# Altium footprint library CONNECTOR HDR.PcbLib: 338 footprints (part 12 of 22)
Each footprint in its own frame and in the unit in brackets; x right, y up, seen from the top. Pads: shape width x height; smd on the part's side, far side on the other; paste and mask are expansions set on the pad; w line width, h text height; cw(c..) or ccw(c..) is an arc to the next point about the centre after c.
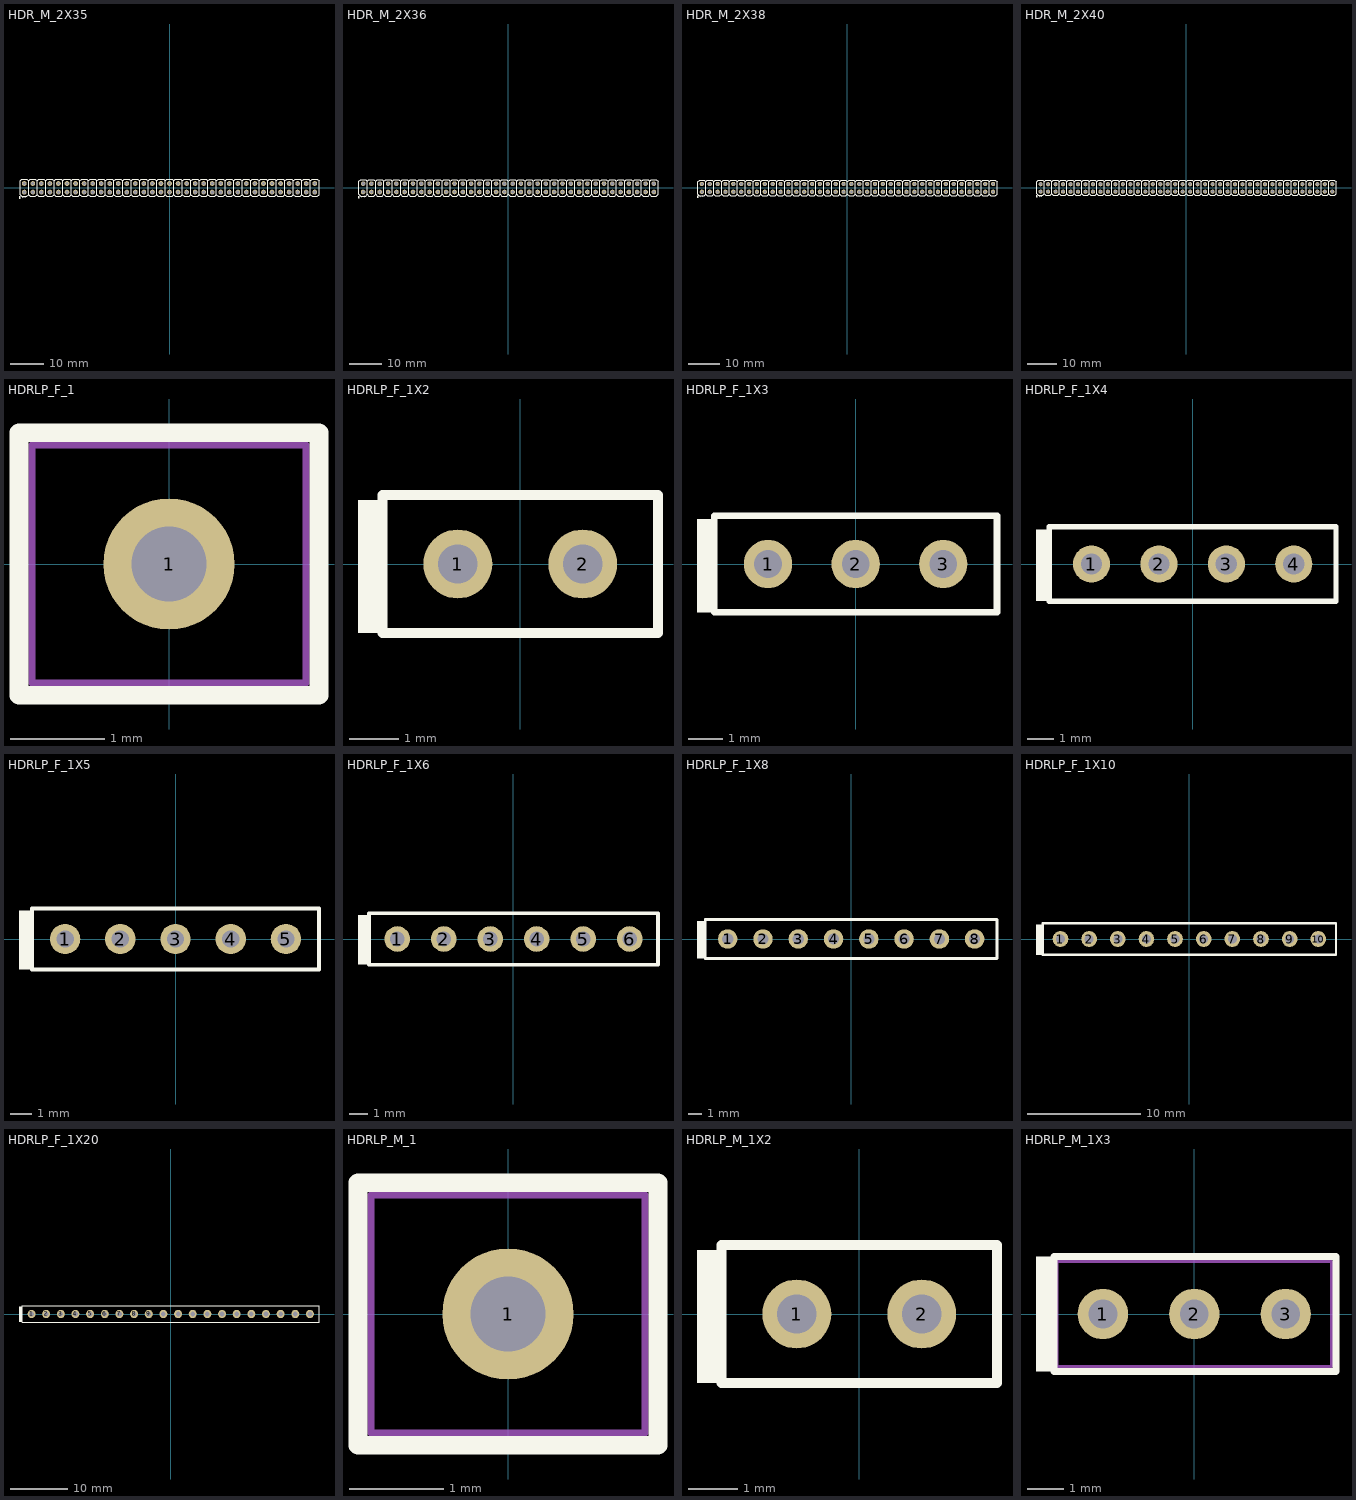
[diagram p11: the footprints below, top view; thin cyan lines are the x and y axes]

## HDR_M_2X35 [mm] "Male Header 2X35 with 2.54 mm Pitch"
pads (70):
  round 1.4 / inner round 1.4 / far side oval 1.4x2.2 hole 1: 1(-43.18,-1.27) 2(-43.18,1.27) 3(-40.64,-1.27) 4(-40.64,1.27) 5(-38.1,-1.27) 6(-38.1,1.27) 7(-35.56,-1.27) 8(-35.56,1.27) 9(-33.02,-1.27) 10(-33.02,1.27) 11(-30.48,-1.27) 12(-30.48,1.27) 13(-27.94,-1.27) 14(-27.94,1.27) 15(-25.4,-1.27) 16(-25.4,1.27) 17(-22.86,-1.27) 18(-22.86,1.27) 19(-20.32,-1.27) 20(-20.32,1.27) 21(-17.78,-1.27) 22(-17.78,1.27) 23(-15.24,-1.27) 24(-15.24,1.27) 25(-12.7,-1.27) 26(-12.7,1.27) 27(-10.16,-1.27) 28(-10.16,1.27) 29(-7.62,-1.27) 30(-7.62,1.27) 31(-5.08,-1.27) 32(-5.08,1.27) 33(-2.54,-1.27) 34(-2.54,1.27) 35(0,-1.27) 36(0,1.27) 37(2.54,-1.27) 38(2.54,1.27) 39(5.08,-1.27) 40(5.08,1.27) 41(7.62,-1.27) 42(7.62,1.27) 43(10.16,-1.27) 44(10.16,1.27) 45(12.7,-1.27) 46(12.7,1.27) 47(15.24,-1.27) 48(15.24,1.27) 49(17.78,-1.27) 50(17.78,1.27) 51(20.32,-1.27) 52(20.32,1.27) 53(22.86,-1.27) 54(22.86,1.27) 55(25.4,-1.27) 56(25.4,1.27) 57(27.94,-1.27) 58(27.94,1.27) 59(30.48,-1.27) 60(30.48,1.27) 61(33.02,-1.27) 62(33.02,1.27) 63(35.56,-1.27) 64(35.56,1.27) 65(38.1,-1.27) 66(38.1,1.27) 67(40.64,-1.27) 68(40.64,1.27) 69(43.18,-1.27) 70(43.18,1.27)
Top Overlay:
  drawing of 247 lines, arcs and shapes, not listed
  text "1" at -42.672,-3.253 h1
  text "1" at -42.672,-3.253 h1
3D body: height 8.43, standoff -2.49, extent 41.91,-2.54 44.45,0
3D body: height 8.43, standoff -2.49, extent 41.91,0 44.45,2.54
3D body: height 8.43, standoff -2.49, extent -44.45,0 -41.91,2.54
3D body: height 8.43, standoff -2.49, extent 39.37,-2.54 41.91,0
3D body: height 8.43, standoff -2.49, extent 36.83,-2.54 39.37,0
3D body: height 8.43, standoff -2.49, extent 34.29,-2.54 36.83,0
3D body: height 8.43, standoff -2.49, extent 31.75,-2.54 34.29,0
3D body: height 8.43, standoff -2.49, extent 29.21,-2.54 31.75,0
3D body: height 8.43, standoff -2.49, extent 26.67,-2.54 29.21,0
3D body: height 8.43, standoff -2.49, extent 24.13,-2.54 26.67,0
3D body: height 8.43, standoff -2.49, extent 21.59,-2.54 24.13,0
3D body: height 8.43, standoff -2.49, extent 19.05,-2.54 21.59,0
3D body: height 8.43, standoff -2.49, extent 16.51,-2.54 19.05,0
3D body: height 8.43, standoff -2.49, extent 13.97,-2.54 16.51,0
3D body: height 8.43, standoff -2.49, extent 11.43,-2.54 13.97,0
3D body: height 8.43, standoff -2.49, extent 8.89,-2.54 11.43,0
3D body: height 8.43, standoff -2.49, extent 6.35,-2.54 8.89,0
3D body: height 8.43, standoff -2.49, extent 3.81,-2.54 6.35,0
3D body: height 8.43, standoff -2.49, extent 1.27,-2.54 3.81,0
3D body: height 8.43, standoff -2.49, extent -1.27,-2.54 1.27,0
3D body: height 8.43, standoff -2.49, extent -3.81,-2.54 -1.27,0
3D body: height 8.43, standoff -2.49, extent -6.35,-2.54 -3.81,0
3D body: height 8.43, standoff -2.49, extent -8.89,-2.54 -6.35,0
3D body: height 8.43, standoff -2.49, extent -11.43,-2.54 -8.89,0
3D body: height 8.43, standoff -2.49, extent -13.97,-2.54 -11.43,0
3D body: height 8.43, standoff -2.49, extent -16.51,-2.54 -13.97,0
3D body: height 8.43, standoff -2.49, extent -19.05,-2.54 -16.51,0
3D body: height 8.43, standoff -2.49, extent -21.59,-2.54 -19.05,0
3D body: height 8.43, standoff -2.49, extent -24.13,-2.54 -21.59,0
3D body: height 8.43, standoff -2.49, extent -26.67,-2.54 -24.13,0
3D body: height 8.43, standoff -2.49, extent -29.21,-2.54 -26.67,0
3D body: height 8.43, standoff -2.49, extent -31.75,-2.54 -29.21,0
3D body: height 8.43, standoff -2.49, extent -34.29,-2.54 -31.75,0
3D body: height 8.43, standoff -2.49, extent -36.83,-2.54 -34.29,0
3D body: height 8.43, standoff -2.49, extent -39.37,-2.54 -36.83,0
3D body: height 8.43, standoff -2.49, extent -41.91,-2.54 -39.37,0
3D body: height 8.43, standoff -2.49, extent -41.91,0 -39.37,2.54
3D body: height 8.43, standoff -2.49, extent 39.37,0 41.91,2.54
3D body: height 8.43, standoff -2.49, extent 36.83,0 39.37,2.54
3D body: height 8.43, standoff -2.49, extent 34.29,0 36.83,2.54
3D body: height 8.43, standoff -2.49, extent 31.75,0 34.29,2.54
3D body: height 8.43, standoff -2.49, extent 29.21,0 31.75,2.54
3D body: height 8.43, standoff -2.49, extent 26.67,0 29.21,2.54
3D body: height 8.43, standoff -2.49, extent 24.13,0 26.67,2.54
3D body: height 8.43, standoff -2.49, extent 21.59,0 24.13,2.54
3D body: height 8.43, standoff -2.49, extent 19.05,0 21.59,2.54
3D body: height 8.43, standoff -2.49, extent 16.51,0 19.05,2.54
3D body: height 8.43, standoff -2.49, extent 13.97,0 16.51,2.54
3D body: height 8.43, standoff -2.49, extent 11.43,0 13.97,2.54
3D body: height 8.43, standoff -2.49, extent 8.89,0 11.43,2.54
3D body: height 8.43, standoff -2.49, extent 6.35,0 8.89,2.54
3D body: height 8.43, standoff -2.49, extent 3.81,0 6.35,2.54
3D body: height 8.43, standoff -2.49, extent 1.27,0 3.81,2.54
3D body: height 8.43, standoff -2.49, extent -1.27,0 1.27,2.54
3D body: height 8.43, standoff -2.49, extent -3.81,0 -1.27,2.54
3D body: height 8.43, standoff -2.49, extent -6.35,0 -3.81,2.54
3D body: height 8.43, standoff -2.49, extent -8.89,0 -6.35,2.54
3D body: height 8.43, standoff -2.49, extent -11.43,0 -8.89,2.54
3D body: height 8.43, standoff -2.49, extent -13.97,0 -11.43,2.54
3D body: height 8.43, standoff -2.49, extent -16.51,0 -13.97,2.54
3D body: height 8.43, standoff -2.49, extent -19.05,0 -16.51,2.54
3D body: height 8.43, standoff -2.49, extent -21.59,0 -19.05,2.54
3D body: height 8.43, standoff -2.49, extent -24.13,0 -21.59,2.54
3D body: height 8.43, standoff -2.49, extent -26.67,0 -24.13,2.54
3D body: height 8.43, standoff -2.49, extent -29.21,0 -26.67,2.54
3D body: height 8.43, standoff -2.49, extent -31.75,0 -29.21,2.54
3D body: height 8.43, standoff -2.49, extent -34.29,0 -31.75,2.54
3D body: height 8.43, standoff -2.49, extent -36.83,0 -34.29,2.54
3D body: height 8.43, standoff -2.49, extent -39.37,0 -36.83,2.54
3D body: height 8.43, standoff -2.49, extent -44.45,-2.54 -41.91,0

## HDR_M_2X36 [mm] "Male Header 2X36 with 2.54 mm Pitch"
pads (72):
  round 1.4 / inner round 1.4 / far side oval 1.4x2.2 hole 1: 1(-44.45,-1.27) 2(-44.45,1.27) 3(-41.91,-1.27) 4(-41.91,1.27) 5(-39.37,-1.27) 6(-39.37,1.27) 7(-36.83,-1.27) 8(-36.83,1.27) 9(-34.29,-1.27) 10(-34.29,1.27) 11(-31.75,-1.27) 12(-31.75,1.27) 13(-29.21,-1.27) 14(-29.21,1.27) 15(-26.67,-1.27) 16(-26.67,1.27) 17(-24.13,-1.27) 18(-24.13,1.27) 19(-21.59,-1.27) 20(-21.59,1.27) 21(-19.05,-1.27) 22(-19.05,1.27) 23(-16.51,-1.27) 24(-16.51,1.27) 25(-13.97,-1.27) 26(-13.97,1.27) 27(-11.43,-1.27) 28(-11.43,1.27) 29(-8.89,-1.27) 30(-8.89,1.27) 31(-6.35,-1.27) 32(-6.35,1.27) 33(-3.81,-1.27) 34(-3.81,1.27) 35(-1.27,-1.27) 36(-1.27,1.27) 37(1.27,-1.27) 38(1.27,1.27) 39(3.81,-1.27) 40(3.81,1.27) 41(6.35,-1.27) 42(6.35,1.27) 43(8.89,-1.27) 44(8.89,1.27) 45(11.43,-1.27) 46(11.43,1.27) 47(13.97,-1.27) 48(13.97,1.27) 49(16.51,-1.27) 50(16.51,1.27) 51(19.05,-1.27) 52(19.05,1.27) 53(21.59,-1.27) 54(21.59,1.27) 55(24.13,-1.27) 56(24.13,1.27) 57(26.67,-1.27) 58(26.67,1.27) 59(29.21,-1.27) 60(29.21,1.27) 61(31.75,-1.27) 62(31.75,1.27) 63(34.29,-1.27) 64(34.29,1.27) 65(36.83,-1.27) 66(36.83,1.27) 67(39.37,-1.27) 68(39.37,1.27) 69(41.91,-1.27) 70(41.91,1.27) 71(44.45,-1.27) 72(44.45,1.27)
Top Overlay:
  drawing of 254 lines, arcs and shapes, not listed
  text "1" at -43.942,-3.253 h1
  text "1" at -43.942,-3.253 h1
3D body: height 8.43, standoff -2.49, extent -45.72,-2.54 -43.18,0
3D body: height 8.43, standoff -2.49, extent -40.64,0 -38.1,2.54
3D body: height 8.43, standoff -2.49, extent -38.1,0 -35.56,2.54
3D body: height 8.43, standoff -2.49, extent -35.56,0 -33.02,2.54
3D body: height 8.43, standoff -2.49, extent -33.02,0 -30.48,2.54
3D body: height 8.43, standoff -2.49, extent -30.48,0 -27.94,2.54
3D body: height 8.43, standoff -2.49, extent -27.94,0 -25.4,2.54
3D body: height 8.43, standoff -2.49, extent -25.4,0 -22.86,2.54
3D body: height 8.43, standoff -2.49, extent -22.86,0 -20.32,2.54
3D body: height 8.43, standoff -2.49, extent -20.32,0 -17.78,2.54
3D body: height 8.43, standoff -2.49, extent -17.78,0 -15.24,2.54
3D body: height 8.43, standoff -2.49, extent -15.24,0 -12.7,2.54
3D body: height 8.43, standoff -2.49, extent -12.7,0 -10.16,2.54
3D body: height 8.43, standoff -2.49, extent -10.16,0 -7.62,2.54
3D body: height 8.43, standoff -2.49, extent -7.62,0 -5.08,2.54
3D body: height 8.43, standoff -2.49, extent -5.08,0 -2.54,2.54
3D body: height 8.43, standoff -2.49, extent -2.54,0 0,2.54
3D body: height 8.43, standoff -2.49, extent 0,0 2.54,2.54
3D body: height 8.43, standoff -2.49, extent 2.54,0 5.08,2.54
3D body: height 8.43, standoff -2.49, extent 5.08,0 7.62,2.54
3D body: height 8.43, standoff -2.49, extent 7.62,0 10.16,2.54
3D body: height 8.43, standoff -2.49, extent 10.16,0 12.7,2.54
3D body: height 8.43, standoff -2.49, extent 12.7,0 15.24,2.54
3D body: height 8.43, standoff -2.49, extent 15.24,0 17.78,2.54
3D body: height 8.43, standoff -2.49, extent 17.78,0 20.32,2.54
3D body: height 8.43, standoff -2.49, extent 20.32,0 22.86,2.54
3D body: height 8.43, standoff -2.49, extent 22.86,0 25.4,2.54
3D body: height 8.43, standoff -2.49, extent 25.4,0 27.94,2.54
3D body: height 8.43, standoff -2.49, extent 27.94,0 30.48,2.54
3D body: height 8.43, standoff -2.49, extent 30.48,0 33.02,2.54
3D body: height 8.43, standoff -2.49, extent 33.02,0 35.56,2.54
3D body: height 8.43, standoff -2.49, extent 35.56,0 38.1,2.54
3D body: height 8.43, standoff -2.49, extent 38.1,0 40.64,2.54
3D body: height 8.43, standoff -2.49, extent 40.64,0 43.18,2.54
3D body: height 8.43, standoff -2.49, extent -43.18,0 -40.64,2.54
3D body: height 8.43, standoff -2.49, extent -43.18,-2.54 -40.64,0
3D body: height 8.43, standoff -2.49, extent -40.64,-2.54 -38.1,0
3D body: height 8.43, standoff -2.49, extent -38.1,-2.54 -35.56,0
3D body: height 8.43, standoff -2.49, extent -35.56,-2.54 -33.02,0
3D body: height 8.43, standoff -2.49, extent -33.02,-2.54 -30.48,0
3D body: height 8.43, standoff -2.49, extent -30.48,-2.54 -27.94,0
3D body: height 8.43, standoff -2.49, extent -27.94,-2.54 -25.4,0
3D body: height 8.43, standoff -2.49, extent -25.4,-2.54 -22.86,0
3D body: height 8.43, standoff -2.49, extent -22.86,-2.54 -20.32,0
3D body: height 8.43, standoff -2.49, extent -20.32,-2.54 -17.78,0
3D body: height 8.43, standoff -2.49, extent -17.78,-2.54 -15.24,0
3D body: height 8.43, standoff -2.49, extent -15.24,-2.54 -12.7,0
3D body: height 8.43, standoff -2.49, extent -12.7,-2.54 -10.16,0
3D body: height 8.43, standoff -2.49, extent -10.16,-2.54 -7.62,0
3D body: height 8.43, standoff -2.49, extent -7.62,-2.54 -5.08,0
3D body: height 8.43, standoff -2.49, extent -5.08,-2.54 -2.54,0
3D body: height 8.43, standoff -2.49, extent -2.54,-2.54 0,0
3D body: height 8.43, standoff -2.49, extent 0,-2.54 2.54,0
3D body: height 8.43, standoff -2.49, extent 2.54,-2.54 5.08,0
3D body: height 8.43, standoff -2.49, extent 5.08,-2.54 7.62,0
3D body: height 8.43, standoff -2.49, extent 7.62,-2.54 10.16,0
3D body: height 8.43, standoff -2.49, extent 10.16,-2.54 12.7,0
3D body: height 8.43, standoff -2.49, extent 12.7,-2.54 15.24,0
3D body: height 8.43, standoff -2.49, extent 15.24,-2.54 17.78,0
3D body: height 8.43, standoff -2.49, extent 17.78,-2.54 20.32,0
3D body: height 8.43, standoff -2.49, extent 20.32,-2.54 22.86,0
3D body: height 8.43, standoff -2.49, extent 22.86,-2.54 25.4,0
3D body: height 8.43, standoff -2.49, extent 25.4,-2.54 27.94,0
3D body: height 8.43, standoff -2.49, extent 27.94,-2.54 30.48,0
3D body: height 8.43, standoff -2.49, extent 30.48,-2.54 33.02,0
3D body: height 8.43, standoff -2.49, extent 33.02,-2.54 35.56,0
3D body: height 8.43, standoff -2.49, extent 35.56,-2.54 38.1,0
3D body: height 8.43, standoff -2.49, extent 38.1,-2.54 40.64,0
3D body: height 8.43, standoff -2.49, extent 40.64,-2.54 43.18,0
3D body: height 8.43, standoff -2.49, extent -45.72,0 -43.18,2.54
3D body: height 8.43, standoff -2.49, extent 43.18,0 45.72,2.54
3D body: height 8.43, standoff -2.49, extent 43.18,-2.54 45.72,0

## HDR_M_2X38 [mm] "Male Header 2X38 with 2.54 mm Pitch"
pads (76):
  round 1.4 / inner round 1.4 / far side oval 1.4x2.2 hole 1: 1(-46.99,-1.27) 2(-46.99,1.27) 3(-44.45,-1.27) 4(-44.45,1.27) 5(-41.91,-1.27) 6(-41.91,1.27) 7(-39.37,-1.27) 8(-39.37,1.27) 9(-36.83,-1.27) 10(-36.83,1.27) 11(-34.29,-1.27) 12(-34.29,1.27) 13(-31.75,-1.27) 14(-31.75,1.27) 15(-29.21,-1.27) 16(-29.21,1.27) 17(-26.67,-1.27) 18(-26.67,1.27) 19(-24.13,-1.27) 20(-24.13,1.27) 21(-21.59,-1.27) 22(-21.59,1.27) 23(-19.05,-1.27) 24(-19.05,1.27) 25(-16.51,-1.27) 26(-16.51,1.27) 27(-13.97,-1.27) 28(-13.97,1.27) 29(-11.43,-1.27) 30(-11.43,1.27) 31(-8.89,-1.27) 32(-8.89,1.27) 33(-6.35,-1.27) 34(-6.35,1.27) 35(-3.81,-1.27) 36(-3.81,1.27) 37(-1.27,-1.27) 38(-1.27,1.27) 39(1.27,-1.27) 40(1.27,1.27) 41(3.81,-1.27) 42(3.81,1.27) 43(6.35,-1.27) 44(6.35,1.27) 45(8.89,-1.27) 46(8.89,1.27) 47(11.43,-1.27) 48(11.43,1.27) 49(13.97,-1.27) 50(13.97,1.27) 51(16.51,-1.27) 52(16.51,1.27) 53(19.05,-1.27) 54(19.05,1.27) 55(21.59,-1.27) 56(21.59,1.27) 57(24.13,-1.27) 58(24.13,1.27) 59(26.67,-1.27) 60(26.67,1.27) 61(29.21,-1.27) 62(29.21,1.27) 63(31.75,-1.27) 64(31.75,1.27) 65(34.29,-1.27) 66(34.29,1.27) 67(36.83,-1.27) 68(36.83,1.27) 69(39.37,-1.27) 70(39.37,1.27) 71(41.91,-1.27) 72(41.91,1.27) 73(44.45,-1.27) 74(44.45,1.27) 75(46.99,-1.27) 76(46.99,1.27)
Top Overlay:
  drawing of 268 lines, arcs and shapes, not listed
  text "1" at -46.482,-3.253 h1
  text "1" at -46.482,-3.253 h1
3D body: height 8.43, standoff -2.49, extent -48.26,-2.54 -45.72,0
3D body: height 8.43, standoff -2.49, extent -43.18,0 -40.64,2.54
3D body: height 8.43, standoff -2.49, extent -40.64,0 -38.1,2.54
3D body: height 8.43, standoff -2.49, extent -38.1,0 -35.56,2.54
3D body: height 8.43, standoff -2.49, extent -35.56,0 -33.02,2.54
3D body: height 8.43, standoff -2.49, extent -33.02,0 -30.48,2.54
3D body: height 8.43, standoff -2.49, extent -30.48,0 -27.94,2.54
3D body: height 8.43, standoff -2.49, extent -27.94,0 -25.4,2.54
3D body: height 8.43, standoff -2.49, extent -25.4,0 -22.86,2.54
3D body: height 8.43, standoff -2.49, extent -22.86,0 -20.32,2.54
3D body: height 8.43, standoff -2.49, extent -20.32,0 -17.78,2.54
3D body: height 8.43, standoff -2.49, extent -17.78,0 -15.24,2.54
3D body: height 8.43, standoff -2.49, extent -15.24,0 -12.7,2.54
3D body: height 8.43, standoff -2.49, extent -12.7,0 -10.16,2.54
3D body: height 8.43, standoff -2.49, extent -10.16,0 -7.62,2.54
3D body: height 8.43, standoff -2.49, extent -7.62,0 -5.08,2.54
3D body: height 8.43, standoff -2.49, extent -5.08,0 -2.54,2.54
3D body: height 8.43, standoff -2.49, extent -2.54,0 0,2.54
3D body: height 8.43, standoff -2.49, extent 0,0 2.54,2.54
3D body: height 8.43, standoff -2.49, extent 2.54,0 5.08,2.54
3D body: height 8.43, standoff -2.49, extent 5.08,0 7.62,2.54
3D body: height 8.43, standoff -2.49, extent 7.62,0 10.16,2.54
3D body: height 8.43, standoff -2.49, extent 10.16,0 12.7,2.54
3D body: height 8.43, standoff -2.49, extent 12.7,0 15.24,2.54
3D body: height 8.43, standoff -2.49, extent 15.24,0 17.78,2.54
3D body: height 8.43, standoff -2.49, extent 17.78,0 20.32,2.54
3D body: height 8.43, standoff -2.49, extent 20.32,0 22.86,2.54
3D body: height 8.43, standoff -2.49, extent 22.86,0 25.4,2.54
3D body: height 8.43, standoff -2.49, extent 25.4,0 27.94,2.54
3D body: height 8.43, standoff -2.49, extent 27.94,0 30.48,2.54
3D body: height 8.43, standoff -2.49, extent 30.48,0 33.02,2.54
3D body: height 8.43, standoff -2.49, extent 33.02,0 35.56,2.54
3D body: height 8.43, standoff -2.49, extent 35.56,0 38.1,2.54
3D body: height 8.43, standoff -2.49, extent 38.1,0 40.64,2.54
3D body: height 8.43, standoff -2.49, extent 40.64,0 43.18,2.54
3D body: height 8.43, standoff -2.49, extent 43.18,0 45.72,2.54
3D body: height 8.43, standoff -2.49, extent -45.72,0 -43.18,2.54
3D body: height 8.43, standoff -2.49, extent -45.72,-2.54 -43.18,0
3D body: height 8.43, standoff -2.49, extent -43.18,-2.54 -40.64,0
3D body: height 8.43, standoff -2.49, extent -40.64,-2.54 -38.1,0
3D body: height 8.43, standoff -2.49, extent -38.1,-2.54 -35.56,0
3D body: height 8.43, standoff -2.49, extent -35.56,-2.54 -33.02,0
3D body: height 8.43, standoff -2.49, extent -33.02,-2.54 -30.48,0
3D body: height 8.43, standoff -2.49, extent -30.48,-2.54 -27.94,0
3D body: height 8.43, standoff -2.49, extent -27.94,-2.54 -25.4,0
3D body: height 8.43, standoff -2.49, extent -25.4,-2.54 -22.86,0
3D body: height 8.43, standoff -2.49, extent -22.86,-2.54 -20.32,0
3D body: height 8.43, standoff -2.49, extent -20.32,-2.54 -17.78,0
3D body: height 8.43, standoff -2.49, extent -17.78,-2.54 -15.24,0
3D body: height 8.43, standoff -2.49, extent -15.24,-2.54 -12.7,0
3D body: height 8.43, standoff -2.49, extent -12.7,-2.54 -10.16,0
3D body: height 8.43, standoff -2.49, extent -10.16,-2.54 -7.62,0
3D body: height 8.43, standoff -2.49, extent -7.62,-2.54 -5.08,0
3D body: height 8.43, standoff -2.49, extent -5.08,-2.54 -2.54,0
3D body: height 8.43, standoff -2.49, extent -2.54,-2.54 0,0
3D body: height 8.43, standoff -2.49, extent 0,-2.54 2.54,0
3D body: height 8.43, standoff -2.49, extent 2.54,-2.54 5.08,0
3D body: height 8.43, standoff -2.49, extent 5.08,-2.54 7.62,0
3D body: height 8.43, standoff -2.49, extent 7.62,-2.54 10.16,0
3D body: height 8.43, standoff -2.49, extent 10.16,-2.54 12.7,0
3D body: height 8.43, standoff -2.49, extent 12.7,-2.54 15.24,0
3D body: height 8.43, standoff -2.49, extent 15.24,-2.54 17.78,0
3D body: height 8.43, standoff -2.49, extent 17.78,-2.54 20.32,0
3D body: height 8.43, standoff -2.49, extent 20.32,-2.54 22.86,0
3D body: height 8.43, standoff -2.49, extent 22.86,-2.54 25.4,0
3D body: height 8.43, standoff -2.49, extent 25.4,-2.54 27.94,0
3D body: height 8.43, standoff -2.49, extent 27.94,-2.54 30.48,0
3D body: height 8.43, standoff -2.49, extent 30.48,-2.54 33.02,0
3D body: height 8.43, standoff -2.49, extent 33.02,-2.54 35.56,0
3D body: height 8.43, standoff -2.49, extent 35.56,-2.54 38.1,0
3D body: height 8.43, standoff -2.49, extent 38.1,-2.54 40.64,0
3D body: height 8.43, standoff -2.49, extent 40.64,-2.54 43.18,0
3D body: height 8.43, standoff -2.49, extent 43.18,-2.54 45.72,0
3D body: height 8.43, standoff -2.49, extent -48.26,0 -45.72,2.54
3D body: height 8.43, standoff -2.49, extent 45.72,0 48.26,2.54
3D body: height 8.43, standoff -2.49, extent 45.72,-2.54 48.26,0

## HDR_M_2X40 [mm] "Male Header 2X40 with 2.54 mm Pitch"
pads (80):
  round 1.4 / inner round 1.4 / far side oval 1.4x2.2 hole 1: 1(-49.53,-1.27) 2(-49.53,1.27) 3(-46.99,-1.27) 4(-46.99,1.27) 5(-44.45,-1.27) 6(-44.45,1.27) 7(-41.91,-1.27) 8(-41.91,1.27) 9(-39.37,-1.27) 10(-39.37,1.27) 11(-36.83,-1.27) 12(-36.83,1.27) 13(-34.29,-1.27) 14(-34.29,1.27) 15(-31.75,-1.27) 16(-31.75,1.27) 17(-29.21,-1.27) 18(-29.21,1.27) 19(-26.67,-1.27) 20(-26.67,1.27) 21(-24.13,-1.27) 22(-24.13,1.27) 23(-21.59,-1.27) 24(-21.59,1.27) 25(-19.05,-1.27) 26(-19.05,1.27) 27(-16.51,-1.27) 28(-16.51,1.27) 29(-13.97,-1.27) 30(-13.97,1.27) 31(-11.43,-1.27) 32(-11.43,1.27) 33(-8.89,-1.27) 34(-8.89,1.27) 35(-6.35,-1.27) 36(-6.35,1.27) 37(-3.81,-1.27) 38(-3.81,1.27) 39(-1.27,-1.27) 40(-1.27,1.27) 41(1.27,-1.27) 42(1.27,1.27) 43(3.81,-1.27) 44(3.81,1.27) 45(6.35,-1.27) 46(6.35,1.27) 47(8.89,-1.27) 48(8.89,1.27) 49(11.43,-1.27) 50(11.43,1.27) 51(13.97,-1.27) 52(13.97,1.27) 53(16.51,-1.27) 54(16.51,1.27) 55(19.05,-1.27) 56(19.05,1.27) 57(21.59,-1.27) 58(21.59,1.27) 59(24.13,-1.27) 60(24.13,1.27) 61(26.67,-1.27) 62(26.67,1.27) 63(29.21,-1.27) 64(29.21,1.27) 65(31.75,-1.27) 66(31.75,1.27) 67(34.29,-1.27) 68(34.29,1.27) 69(36.83,-1.27) 70(36.83,1.27) 71(39.37,-1.27) 72(39.37,1.27) 73(41.91,-1.27) 74(41.91,1.27) 75(44.45,-1.27) 76(44.45,1.27) 77(46.99,-1.27) 78(46.99,1.27) 79(49.53,-1.27) 80(49.53,1.27)
Top Overlay:
  drawing of 282 lines, arcs and shapes, not listed
  text "1" at -49.022,-3.253 h1
  text "1" at -49.022,-3.253 h1
3D body: height 8.43, standoff -2.49, extent -50.8,-2.54 -48.26,0
3D body: height 8.43, standoff -2.49, extent -45.72,0 -43.18,2.54
3D body: height 8.43, standoff -2.49, extent -43.18,0 -40.64,2.54
3D body: height 8.43, standoff -2.49, extent -40.64,0 -38.1,2.54
3D body: height 8.43, standoff -2.49, extent -38.1,0 -35.56,2.54
3D body: height 8.43, standoff -2.49, extent -35.56,0 -33.02,2.54
3D body: height 8.43, standoff -2.49, extent -33.02,0 -30.48,2.54
3D body: height 8.43, standoff -2.49, extent -30.48,0 -27.94,2.54
3D body: height 8.43, standoff -2.49, extent -27.94,0 -25.4,2.54
3D body: height 8.43, standoff -2.49, extent -25.4,0 -22.86,2.54
3D body: height 8.43, standoff -2.49, extent -22.86,0 -20.32,2.54
3D body: height 8.43, standoff -2.49, extent -20.32,0 -17.78,2.54
3D body: height 8.43, standoff -2.49, extent -17.78,0 -15.24,2.54
3D body: height 8.43, standoff -2.49, extent -15.24,0 -12.7,2.54
3D body: height 8.43, standoff -2.49, extent -12.7,0 -10.16,2.54
3D body: height 8.43, standoff -2.49, extent -10.16,0 -7.62,2.54
3D body: height 8.43, standoff -2.49, extent -7.62,0 -5.08,2.54
3D body: height 8.43, standoff -2.49, extent -5.08,0 -2.54,2.54
3D body: height 8.43, standoff -2.49, extent -2.54,0 0,2.54
3D body: height 8.43, standoff -2.49, extent 0,0 2.54,2.54
3D body: height 8.43, standoff -2.49, extent 2.54,0 5.08,2.54
3D body: height 8.43, standoff -2.49, extent 5.08,0 7.62,2.54
3D body: height 8.43, standoff -2.49, extent 7.62,0 10.16,2.54
3D body: height 8.43, standoff -2.49, extent 10.16,0 12.7,2.54
3D body: height 8.43, standoff -2.49, extent 12.7,0 15.24,2.54
3D body: height 8.43, standoff -2.49, extent 15.24,0 17.78,2.54
3D body: height 8.43, standoff -2.49, extent 17.78,0 20.32,2.54
3D body: height 8.43, standoff -2.49, extent 20.32,0 22.86,2.54
3D body: height 8.43, standoff -2.49, extent 22.86,0 25.4,2.54
3D body: height 8.43, standoff -2.49, extent 25.4,0 27.94,2.54
3D body: height 8.43, standoff -2.49, extent 27.94,0 30.48,2.54
3D body: height 8.43, standoff -2.49, extent 30.48,0 33.02,2.54
3D body: height 8.43, standoff -2.49, extent 33.02,0 35.56,2.54
3D body: height 8.43, standoff -2.49, extent 35.56,0 38.1,2.54
3D body: height 8.43, standoff -2.49, extent 38.1,0 40.64,2.54
3D body: height 8.43, standoff -2.49, extent 40.64,0 43.18,2.54
3D body: height 8.43, standoff -2.49, extent 43.18,0 45.72,2.54
3D body: height 8.43, standoff -2.49, extent 45.72,0 48.26,2.54
3D body: height 8.43, standoff -2.49, extent -48.26,0 -45.72,2.54
3D body: height 8.43, standoff -2.49, extent -48.26,-2.54 -45.72,0
3D body: height 8.43, standoff -2.49, extent -45.72,-2.54 -43.18,0
3D body: height 8.43, standoff -2.49, extent -43.18,-2.54 -40.64,0
3D body: height 8.43, standoff -2.49, extent -40.64,-2.54 -38.1,0
3D body: height 8.43, standoff -2.49, extent -38.1,-2.54 -35.56,0
3D body: height 8.43, standoff -2.49, extent -35.56,-2.54 -33.02,0
3D body: height 8.43, standoff -2.49, extent -33.02,-2.54 -30.48,0
3D body: height 8.43, standoff -2.49, extent -30.48,-2.54 -27.94,0
3D body: height 8.43, standoff -2.49, extent -27.94,-2.54 -25.4,0
3D body: height 8.43, standoff -2.49, extent -25.4,-2.54 -22.86,0
3D body: height 8.43, standoff -2.49, extent -22.86,-2.54 -20.32,0
3D body: height 8.43, standoff -2.49, extent -20.32,-2.54 -17.78,0
3D body: height 8.43, standoff -2.49, extent -17.78,-2.54 -15.24,0
3D body: height 8.43, standoff -2.49, extent -15.24,-2.54 -12.7,0
3D body: height 8.43, standoff -2.49, extent -12.7,-2.54 -10.16,0
3D body: height 8.43, standoff -2.49, extent -10.16,-2.54 -7.62,0
3D body: height 8.43, standoff -2.49, extent -7.62,-2.54 -5.08,0
3D body: height 8.43, standoff -2.49, extent -5.08,-2.54 -2.54,0
3D body: height 8.43, standoff -2.49, extent -2.54,-2.54 0,0
3D body: height 8.43, standoff -2.49, extent 0,-2.54 2.54,0
3D body: height 8.43, standoff -2.49, extent 2.54,-2.54 5.08,0
3D body: height 8.43, standoff -2.49, extent 5.08,-2.54 7.62,0
3D body: height 8.43, standoff -2.49, extent 7.62,-2.54 10.16,0
3D body: height 8.43, standoff -2.49, extent 10.16,-2.54 12.7,0
3D body: height 8.43, standoff -2.49, extent 12.7,-2.54 15.24,0
3D body: height 8.43, standoff -2.49, extent 15.24,-2.54 17.78,0
3D body: height 8.43, standoff -2.49, extent 17.78,-2.54 20.32,0
3D body: height 8.43, standoff -2.49, extent 20.32,-2.54 22.86,0
3D body: height 8.43, standoff -2.49, extent 22.86,-2.54 25.4,0
3D body: height 8.43, standoff -2.49, extent 25.4,-2.54 27.94,0
3D body: height 8.43, standoff -2.49, extent 27.94,-2.54 30.48,0
3D body: height 8.43, standoff -2.49, extent 30.48,-2.54 33.02,0
3D body: height 8.43, standoff -2.49, extent 33.02,-2.54 35.56,0
3D body: height 8.43, standoff -2.49, extent 35.56,-2.54 38.1,0
3D body: height 8.43, standoff -2.49, extent 38.1,-2.54 40.64,0
3D body: height 8.43, standoff -2.49, extent 40.64,-2.54 43.18,0
3D body: height 8.43, standoff -2.49, extent 43.18,-2.54 45.72,0
3D body: height 8.43, standoff -2.49, extent 45.72,-2.54 48.26,0
3D body: height 8.43, standoff -2.49, extent -50.8,0 -48.26,2.54
3D body: height 8.43, standoff -2.49, extent 48.26,0 50.8,2.54
3D body: height 8.43, standoff -2.49, extent 48.26,-2.54 50.8,0

## HDRLP_F_1 [mm] "Connector Socket, Single-row 1-position, 0.100\" pitch"
height 4.191
pads (1):
  round 1.4 / inner round 1.4 / far side oval 1.4x2.2 hole 0.8: 1(0,0)
Top Overlay:
  lines w0.2: -1.6,-1.4 -1.6,1.4 1.6,1.4 1.6,-1.4 -1.6,-1.4
Mechanical 13:
  lines w0.076: -1.46,-1.27 -1.46,1.27 1.46,1.27 1.46,-1.27 -1.46,-1.27
3D body: height 4.19, standoff -3.17, extent -1.46,-1.27 1.46,1.27

## HDRLP_F_1X2 [mm] "Connector Socket, Single-row 1-position, 0.100\" pitch"
height 4.191
pads (2):
  round 1.4 / inner round 1.4 / far side oval 1.4x2.2 hole 0.8 mask+0.1: 1(-1.27,0) 2(1.27,0)
Top Overlay:
  rectangle: -3.3,-1.4 -2.8,1.3
  lines w0.2: -2.8,-1.4 -2.8,1.4 2.8,1.4 2.8,-1.4 -2.8,-1.4
3D body: height 4.19, standoff -3.17, extent -2.73,-1.27 0.19,1.27
3D body: height 4.19, standoff -3.17, extent -0.19,-1.27 2.73,1.27

## HDRLP_F_1X3 [mm] "Connector Socket, Single-row 1-position, 0.100\" pitch"
height 4.191
pads (3):
  round 1.4 / inner round 1.4 / far side oval 1.4x2.2 hole 0.8: 1(-2.54,0) 2(0,0) 3(2.54,0)
Top Overlay:
  rectangle: -4.6,-1.4 -4.1,1.3
  lines w0.2: -4.1,-1.4 4.1,-1.4 4.1,1.4 -4.1,1.4 -4.1,-1.4
3D body: height 4.19, standoff -3.17, extent -1.46,-1.27 1.46,1.27
3D body: height 4.19, standoff -3.17, extent -4,-1.27 -1.08,1.27
3D body: height 4.19, standoff -3.17, extent 1.08,-1.27 4,1.27

## HDRLP_F_1X4 [mm] "Connector Socket, Single-row 1-position, 0.100\" pitch"
height 4.191
pads (4):
  round 1.4 / inner round 1.4 / far side oval 1.4x2.2 hole 0.8 mask+0.1: 1(-3.81,0) 2(-1.27,0) 3(1.27,0) 4(3.81,0)
Top Overlay:
  rectangle: -5.9,-1.4 -5.4,1.3
  lines w0.2: -5.4,-1.4 -5.4,1.4 5.4,1.4 5.4,-1.4 -5.4,-1.4
3D body: height 4.19, standoff -3.17, extent -5.27,-1.27 -2.35,1.27
3D body: height 4.19, standoff -3.17, extent -2.73,-1.27 0.19,1.27
3D body: height 4.19, standoff -3.17, extent -0.19,-1.27 2.73,1.27
3D body: height 4.19, standoff -3.17, extent 2.35,-1.27 5.27,1.27

## HDRLP_F_1X5 [mm] "Connector Socket, Single-row 1-position, 0.100\" pitch"
height 4.191
pads (5):
  round 1.4 / inner round 1.4 / far side oval 1.4x2.2 hole 0.8 mask+0.1: 1(-5.08,0) 2(-2.54,0) 3(0,0) 4(2.54,0) 5(5.08,0)
Top Overlay:
  rectangle: -7.2,-1.4 -6.7,1.3
  lines w0.2: -6.6,-1.4 -6.6,1.4 6.6,1.4 6.6,-1.4 -6.6,-1.4
3D body: height 4.19, standoff -3.17, extent 3.62,-1.27 6.54,1.27
3D body: height 4.19, standoff -3.17, extent 1.08,-1.27 4,1.27
3D body: height 4.19, standoff -3.17, extent -6.54,-1.27 -3.62,1.27
3D body: height 4.19, standoff -3.17, extent -4,-1.27 -1.08,1.27
3D body: height 4.19, standoff -3.17, extent -1.46,-1.27 1.46,1.27

## HDRLP_F_1X6 [mm] "Connector Socket, Single-row 1-position, 0.100\" pitch"
height 4.191
pads (6):
  round 1.4 / inner round 1.4 / far side oval 1.4x2.2 hole 0.8 mask+0.1: 1(-6.35,0) 2(-3.81,0) 3(-1.27,0) 4(1.27,0) 5(3.81,0) 6(6.35,0)
Top Overlay:
  rectangle: -8.5,-1.4 -8,1.3
  lines w0.2: -7.9,-1.4 7.9,-1.4 7.9,1.4 -7.9,1.4 -7.9,-1.4
3D body: height 4.19, standoff -3.17, extent 4.89,-1.27 7.81,1.27
3D body: height 4.19, standoff -3.17, extent -0.19,-1.27 2.73,1.27
3D body: height 4.19, standoff -3.17, extent 2.35,-1.27 5.27,1.27
3D body: height 4.19, standoff -3.17, extent -5.27,-1.27 -2.35,1.27
3D body: height 4.19, standoff -3.17, extent -7.81,-1.27 -4.89,1.27
3D body: height 4.19, standoff -3.17, extent -2.73,-1.27 0.19,1.27

## HDRLP_F_1X8 [mm] "Connector Socket, Single-row 1-position, 0.100\" pitch"
height 4.191
pads (8):
  round 1.4 / inner round 1.4 / far side oval 1.4x2.2 hole 0.8 mask+0.1: 1(-8.89,0) 2(-6.35,0) 3(-3.81,0) 4(-1.27,0) 5(1.27,0) 6(3.81,0) 7(6.35,0) 8(8.89,0)
Top Overlay:
  rectangle: -11.1,-1.4 -10.6,1.3
  lines w0.2: -10.5,-1.4 10.5,-1.4 10.5,1.4 -10.5,1.4 -10.5,-1.4
3D body: height 4.19, standoff -3.17, extent -7.81,-1.27 -4.89,1.27
3D body: height 4.19, standoff -3.17, extent -10.35,-1.27 -7.43,1.27
3D body: height 4.19, standoff -3.17, extent -2.73,-1.27 0.19,1.27
3D body: height 4.19, standoff -3.17, extent -5.27,-1.27 -2.35,1.27
3D body: height 4.19, standoff -3.17, extent -0.19,-1.27 2.73,1.27
3D body: height 4.19, standoff -3.17, extent 4.89,-1.27 7.81,1.27
3D body: height 4.19, standoff -3.17, extent 2.35,-1.27 5.27,1.27
3D body: height 4.19, standoff -3.17, extent 7.43,-1.27 10.35,1.27

## HDRLP_F_1X10 [mm] "Connector Socket, Single-row 1-position, 0.100\" pitch"
height 4.191
pads (10):
  round 1.4 / inner round 1.4 / far side oval 1.4x2.2 hole 0.8 mask+0.1: 1(-11.43,0) 2(-8.89,0) 3(-6.35,0) 4(-3.81,0) 5(-1.27,0) 6(1.27,0) 7(3.81,0) 8(6.35,0) 9(8.89,0) 10(11.43,0)
Top Overlay:
  rectangle: -13.6,-1.4 -13.1,1.3
  lines w0.2: -13,-1.4 -13,1.4 13,1.4 13,-1.4 -13,-1.4
3D body: height 4.19, standoff -3.17, extent 7.43,-1.27 10.35,1.27
3D body: height 4.19, standoff -3.17, extent 9.97,-1.27 12.89,1.27
3D body: height 4.19, standoff -3.17, extent 4.89,-1.27 7.81,1.27
3D body: height 4.19, standoff -3.17, extent -0.19,-1.27 2.73,1.27
3D body: height 4.19, standoff -3.17, extent 2.35,-1.27 5.27,1.27
3D body: height 4.19, standoff -3.17, extent -7.81,-1.27 -4.89,1.27
3D body: height 4.19, standoff -3.17, extent -12.89,-1.27 -9.97,1.27
3D body: height 4.19, standoff -3.17, extent -10.35,-1.27 -7.43,1.27
3D body: height 4.19, standoff -3.17, extent -5.27,-1.27 -2.35,1.27
3D body: height 4.19, standoff -3.17, extent -2.73,-1.27 0.19,1.27

## HDRLP_F_1X20 [mm] "HEADER, FEMALE, MILITARY"
height 15
pads (20):
  round 1.4 / inner round 1.4 / far side oval 1.4x2.2 hole 0.8: 1(-24.13,0) 2(-21.59,0) 3(-19.05,0) 4(-16.51,0) 5(-13.97,0) 6(-11.43,0) 7(-8.89,0) 8(-6.35,0) 9(-3.81,0) 10(-1.27,0) 11(1.27,0) 12(3.81,0) 13(6.35,0) 14(8.89,0) 15(11.43,0) 16(13.97,0) 17(16.51,0) 18(19.05,0) 19(21.59,0) 20(24.13,0)
Top Overlay:
  rectangle: -26.3,-1.4 -25.8,1.3
  lines w0.2: -25.7,-1.4 -25.7,1.4 25.7,1.4 25.7,-1.4 -25.7,-1.4
3D body: height 4.19, standoff -3.17, extent 9.97,-1.27 12.89,1.27
3D body: height 4.19, standoff -3.17, extent 7.43,-1.27 10.35,1.27
3D body: height 4.19, standoff -3.17, extent 2.35,-1.27 5.27,1.27
3D body: height 4.19, standoff -3.17, extent -0.19,-1.27 2.73,1.27
3D body: height 4.19, standoff -3.17, extent 4.89,-1.27 7.81,1.27
3D body: height 4.19, standoff -3.17, extent 15.05,-1.27 17.97,1.27
3D body: height 4.19, standoff -3.17, extent 12.51,-1.27 15.43,1.27
3D body: height 4.19, standoff -3.17, extent 17.59,-1.27 20.51,1.27
3D body: height 4.19, standoff -3.17, extent 22.67,-1.27 25.59,1.27
3D body: height 4.19, standoff -3.17, extent 20.13,-1.27 23.05,1.27
3D body: height 4.19, standoff -3.17, extent -5.27,-1.27 -2.35,1.27
3D body: height 4.19, standoff -3.17, extent -2.73,-1.27 0.19,1.27
3D body: height 4.19, standoff -3.17, extent -7.81,-1.27 -4.89,1.27
3D body: height 4.19, standoff -3.17, extent -12.89,-1.27 -9.97,1.27
3D body: height 4.19, standoff -3.17, extent -10.35,-1.27 -7.43,1.27
3D body: height 4.19, standoff -3.17, extent -20.51,-1.27 -17.59,1.27
3D body: height 4.19, standoff -3.17, extent -25.59,-1.27 -22.67,1.27
3D body: height 4.19, standoff -3.17, extent -23.05,-1.27 -20.13,1.27
3D body: height 4.19, standoff -3.17, extent -17.97,-1.27 -15.05,1.27
3D body: height 4.19, standoff -3.17, extent -15.43,-1.27 -12.51,1.27

## HDRLP_M_1 [mm] "HEADER, LowProfile, Single-row 1-position, 0.100\" pitch"
height 6.782
pads (1):
  round 1.4 / inner round 1.4 / far side oval 1.4x2.2 hole 0.8: 1(0,0)
Top Overlay:
  lines w0.2: -1.6,-1.4 1.6,-1.4 1.6,1.4 -1.6,1.4 -1.6,-1.4
Mechanical 13:
  lines w0.076: -1.46,-1.27 1.46,-1.27 1.46,1.27 -1.46,1.27 -1.46,-1.27
3D body: height 6.78, standoff -3, extent -1.46,-1.27 1.46,1.27

## HDRLP_M_1X2 [mm] "Connector Socket, Single-row 1-position, 0.100\" pitch"
height 4.191
pads (2):
  round 1.4 / inner round 1.4 / far side oval 1.4x2.2 hole 0.8 mask+0.1: 1(-1.27,0) 2(1.27,0)
Top Overlay:
  rectangle: -3.3,-1.4 -2.8,1.3
  lines w0.2: -2.8,-1.4 2.8,-1.4 2.8,1.4 -2.8,1.4 -2.8,-1.4
3D body: height 6.78, standoff -3, extent -0.19,-1.27 2.73,1.27
3D body: height 6.78, standoff -3, extent -2.73,-1.27 0.19,1.27

## HDRLP_M_1X3 [mm] "Connector Header, Single-row 3-position, 0.100\" pitch"
height 6.782
pads (3):
  round 1.4 / inner round 1.4 / far side oval 1.4x2.2 hole 0.8: 1(-2.54,0) 2(0,0) 3(2.54,0)
Top Overlay:
  rectangle: -4.4,-1.6 -3.9,1.6
  lines w0.2: -3.9,-1.6 3.937,-1.6 3.937,1.6 -3.9,1.6 -3.9,-1.6
Mechanical 13:
  lines w0.076: -3.81,-1.46 3.81,-1.46 3.81,1.46 -3.81,1.46 -3.81,-1.46
3D body: height 6.78, standoff -3, extent -3.81,-1.46 -1.27,1.46
3D body: height 6.78, standoff -3, extent -1.27,-1.46 1.27,1.46
3D body: height 6.78, standoff -3, extent 1.27,-1.46 3.81,1.46